# Altium footprint library BaseLib.PcbLib: 62 footprints (part 4 of 4)
Each footprint in its own frame and in the unit in brackets; x right, y up, seen from the top. Pads: shape width x height; smd on the part's side, far side on the other; paste and mask are expansions set on the pad; w line width, h text height; cw(c..) or ccw(c..) is an arc to the next point about the centre after c.
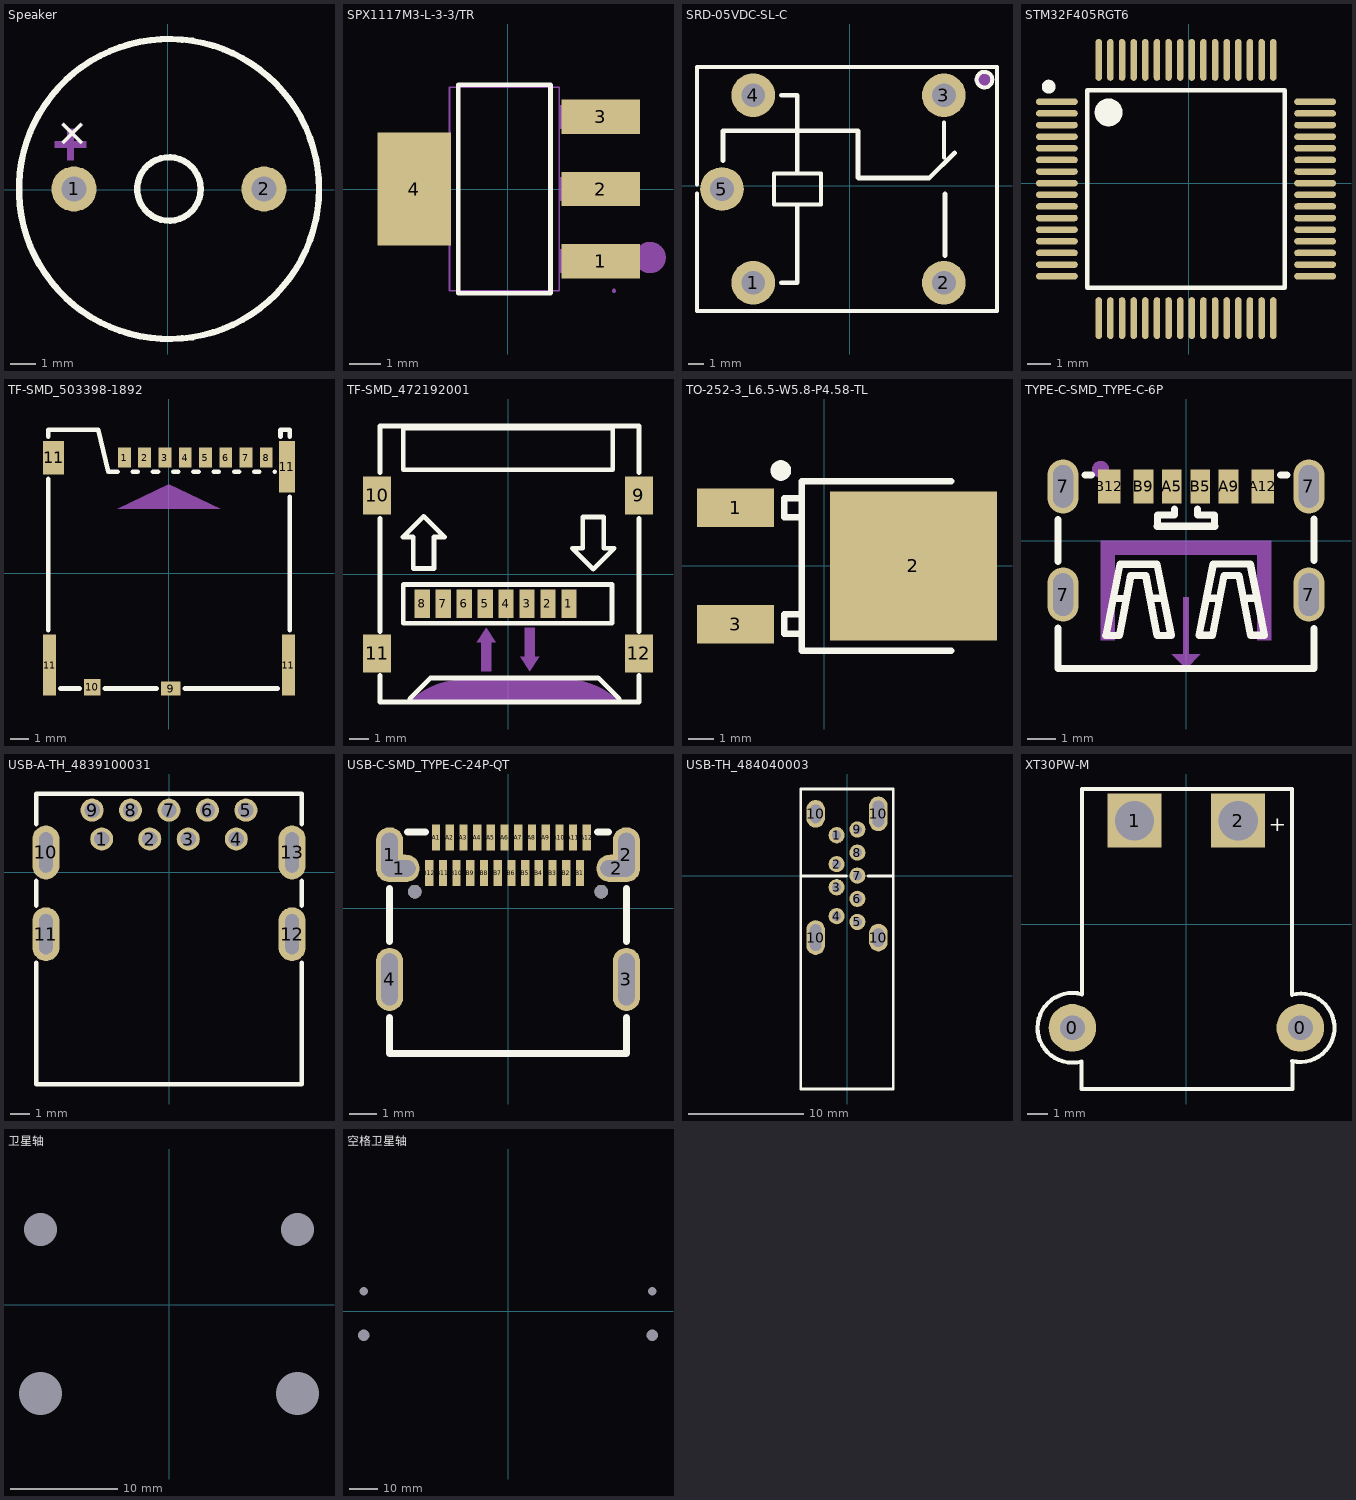
[diagram p3: the footprints below, top view; thin cyan lines are the x and y axes]

## Speaker [mm]
pads (2):
  round 1.8 hole 1: 1(-3.752,0.031) 2(3.848,0.031)
Top Overlay:
  circle w0.254: c0.047,0.031 r6
  circle w0.254: c0.047,0.031 r1.27
  text "+" at -3.948,1.347 h1.27
Mechanical 15:
  region: -4.016,1.301 -4.016,2.444 -3.762,2.444 -3.762,1.174 -4.016,1.174
  region: -4.397,1.936 -3.254,1.936 -3.254,1.682 -4.524,1.682 -4.524,1.936
3D body "Buzzer_Active.stp": height 9.6, standoff -2.6, extent -5.81,-6.052 6.04,5.798

## SPX1117M3-L-3-3/TR [mm] "SOT-223-3_L6.5-W3.4-P2.30-LS7.0-BR"
pads (4):
  rect 2.5x1.1 smd mask+0.051: 1(2.97,-2.3) 2(2.97,0) 3(2.97,2.3)
  rect 2.34x3.6 smd mask+0.051: 4(-2.97,0)
Top Overlay:
  lines w0.152: -1.571,-3.326 1.371,-3.326 1.371,3.326 -1.571,3.326 -1.571,-3.326
Mechanical 6:
  circle w0.5: c4.552,-2.188 r0.25
Mechanical 15:
  region: -3.6,-1.5 -3.6,1.5 -2.85,1.5 -2.85,-1.5
  region: -2.86,-1.5 -2.86,1.5 -1.84,1.5 -1.84,-1.5
  region: 2.65,-2.675 2.65,-1.925 3.4,-1.925 3.4,-2.675
  region: 1.64,-2.675 1.64,-1.925 2.66,-1.925 2.66,-2.675
  region: 2.65,-0.375 2.65,0.375 3.4,0.375 3.4,-0.375
  region: 1.64,-0.375 1.64,0.375 2.66,0.375 2.66,-0.375
  region: 2.65,1.925 2.65,2.675 3.4,2.675 3.4,1.925
  region: 1.64,1.925 1.64,2.675 2.66,2.675 2.66,1.925
  region: 3.46,-3.25 3.46,-3.225 3.425,-3.19 3.375,-3.19 3.34,-3.225 3.34,-3.25 3.34,-3.275 3.375,-3.31 3.425,-3.31 3.46,-3.275
  lines w0.051: -1.85,-3.25 1.65,-3.25 1.65,3.25 -1.85,3.25 -1.85,-3.25
3D body "SOT223-3_MXL.step": height 1.81, standoff 0, extent -3.645,-3.353 3.645,3.353

## SRD-05VDC-SL-C [mil]
pads (5):
  round 110 hole 60: 1(-243.3,-244.13) 2(237.01,-244.11) 3(237.01,228.29) 4(-243.3,228.31) 5(-322.04,-7.91)
Top Overlay:
  circle w10: c339.38,267.7 r19.69
  lines w10: -385,-19.52 -385,-315 370.92,-315 370.91,299.17 ; -385,3.69 -385,299.18 370.91,299.18 ; 236.99,71.59 236.99,159.29 ; -191.13,-47.28 -73.02,-47.28 -73.02,31.46 -191.13,31.46 -191.13,-47.28
  lines w11.81: -319.35,62.95 -319.35,138.83 20.65,138.83 20.65,20.72 21.6,19.77 179.71,19.77 199.71,19.77 ; -172.82,-244.13 -132.75,-244.13 -132.75,-49.3 ; -172.82,228.31 -132.75,228.31 -132.75,33.46 ; 199.62,19.69 264.6,82.99 ; 239.71,-175.51 239.71,-20.21
Mechanical 15:
  circle w19.68: c339.38,267.7 r9.84
3D body "relay srd05vdc-sl-c.SLDPRT": height 590.95, standoff -177.17, extent -379.01,-300.28 369.02,290.28

## STM32F405RGT6 [mm] "LQFP-64_L10.0-W10.0-P0.50-LS12.0-BL"
pads (64):
  oval 1.796x0.28 smd: 1(-5.677,3.496) 2(-5.677,2.996) 3(-5.677,2.496) 4(-5.677,1.996) 5(-5.677,1.496) 6(-5.677,0.996) 7(-5.677,0.496) 8(-5.677,-0.004) 9(-5.677,-0.504) 10(-5.677,-1.004) 11(-5.677,-1.504) 12(-5.677,-2.004) 13(-5.677,-2.504) 14(-5.677,-3.004) 15(-5.677,-3.504) 16(-5.677,-4.004) 33(5.423,-4.004) 34(5.423,-3.504) 35(5.423,-3.004) 36(5.423,-2.504) 37(5.423,-2.004) 38(5.423,-1.504) 39(5.423,-1.004) 40(5.423,-0.504) 41(5.423,-0.004) 42(5.423,0.496) 43(5.423,0.996) 44(5.423,1.496) 45(5.423,1.996) 46(5.423,2.496) 47(5.423,2.996) 48(5.423,3.496)
  oval 0.28x1.796 smd: 17(-3.877,-5.804) 18(-3.377,-5.804) 19(-2.877,-5.804) 20(-2.377,-5.804) 21(-1.877,-5.804) 22(-1.377,-5.804) 23(-0.877,-5.804) 24(-0.377,-5.804) 25(0.123,-5.804) 26(0.623,-5.804) 27(1.123,-5.804) 28(1.623,-5.804) 29(2.123,-5.804) 30(2.623,-5.804) 31(3.123,-5.804) 32(3.623,-5.804) 49(3.623,5.296) 50(3.123,5.296) 51(2.623,5.296) 52(2.123,5.296) 53(1.623,5.296) 54(1.123,5.296) 55(0.623,5.296) 56(0.123,5.296) 57(-0.377,5.296) 58(-0.877,5.296) 59(-1.377,5.296) 60(-1.877,5.296) 61(-2.377,5.296) 62(-2.877,5.296) 63(-3.377,5.296) 64(-3.877,5.296)
Top Overlay:
  lines w0.2: -4.377,-4.504 4.123,-4.504 4.123,3.996 -4.377,3.996 -4.377,-4.504
  lines w0.3: -5.878,4.143 cw(c-6.028,4.144) -5.878,4.145
  lines w0.6: -3.152,3.04 cw(c-3.452,3.043) -3.152,3.045
3D body "User Library-LQFP64-0_5.STEP": height 1.55, standoff -0.02, extent -6.013,-6.14 5.759,5.632

## TF-SMD_503398-1892 [mm]
pads (14):
  rect 0.7x1.1 smd: 1(-2.42,6.27) 2(-1.32,6.27) 3(-0.22,6.27) 4(0.88,6.27) 5(1.98,6.27) 6(3.08,6.27) 7(4.18,6.27) 8(5.28,6.27)
  rect 1.05x0.78 smd: 9(0.095,-6.27)
  rect 0.9x0.9 smd: 10(-4.17,-6.21)
  rect 0.7x3.33 smd: 11(-6.48,-4.995) 11(6.48,-4.995)
  rect 1.14x1.83 smd: 11(-6.26,6.255)
  rect 0.86x2.8 smd: 11(6.4,5.77)
Top Overlay:
  lines w0.254: -6.55,-3.099 -6.55,5.109 ; -6.55,7.401 -6.55,7.78 -3.85,7.78 -3.3,5.5 -2.795,5.5 ; -5.899,-6.27 -4.851,-6.27 ; -3.489,-6.27 -1.1,-6.27 -0.661,-6.27 ; -1.965,5.5 -1.695,5.5 ; -0.865,5.5 -0.595,5.5 ; 0.235,5.5 0.505,5.5 ; 0.851,-6.27 0.935,-6.27 5.899,-6.27 ; 1.335,5.5 1.605,5.5 ; 2.435,5.5 2.705,5.5 ; 3.535,5.5 3.805,5.5 ; 4.635,5.5 4.905,5.5 ; 5.735,5.5 5.739,5.5 ; 6.05,7.401 6.05,7.78 6.55,7.78 6.55,7.401 ; 6.55,-3.099 6.55,4.139
Mechanical 15:
  region: 2.794,3.492 -2.794,3.493 0,4.826

## TF-SMD_472192001 [mm]
pads (12):
  rect 0.8x1.5 smd: 1(3.2,-1.55) 2(2.1,-1.55) 3(1,-1.55) 4(-0.1,-1.55) 5(-1.2,-1.55) 6(-2.3,-1.55) 7(-3.4,-1.55) 8(-4.5,-1.55)
  rect 1.45x2 smd: 9(6.88,4.15) 10(-6.88,4.15) 11(-6.88,-4.15) 12(6.88,-4.15)
Top Overlay:
  lines w0.254: -6.731,-5.3 -6.731,-6.7 6.89,-6.7 ; -6.731,-3 -6.731,2.95 ; -6.731,5.35 -6.731,7.787 ; -6.731,7.797 6.89,7.797 6.89,5.35 ; -6.71,-6.7 6.89,-6.7 ; -5.163,-6.662 -5.163,-6.531 -4.063,-5.432 4.737,-5.432 5.837,-6.532 5.837,-6.662 ; 6.89,-5.3 6.89,-6.7 ; 6.89,-3 6.89,2.95 ; -5.531,1.959 -4.98,2.51 -4.431,3.059 -3.88,2.51 -3.331,1.959 -3.88,1.959 -3.88,0.308 -4.98,0.308 -4.98,1.959 -5.531,1.959 ; -5.5,-2.562 -5.5,-0.53 5.461,-0.53 5.461,-2.562 -5.5,-2.562 ; -5.5,5.497 -5.5,7.697 5.5,7.697 5.5,5.497 -5.5,5.497 ; 3.379,1.372 3.928,1.372 3.928,3.023 5.028,3.023 5.028,1.372 5.579,1.372 5.028,0.821 4.479,0.272 3.928,0.821 3.379,1.372
Mechanical 15:
  region: 1.143,-5.08 1.651,-4.318 1.397,-4.318 1.397,-2.794 0.889,-2.794 0.889,-4.318 0.635,-4.318
  region: -1.143,-2.794 -1.651,-3.556 -1.397,-3.556 -1.397,-5.08 -0.889,-5.08 -0.889,-3.556 -0.635,-3.556
  region: -5.17,-6.7 -5.029,-6.559 -4.72,-6.306 -4.388,-6.084 -4.036,-5.896 -3.667,-5.743 -3.285,-5.627 -2.894,-5.549 -2.497,-5.51 -2.297,-5.51 2.864,-5.51 3.066,-5.502 3.472,-5.528 3.872,-5.595 4.263,-5.703 4.641,-5.851 5.002,-6.038 5.342,-6.26 5.657,-6.516 5.8,-6.66

## TO-252-3_L6.5-W5.8-P4.58-TL [mm]
pads (3):
  rect 3x1.5 smd: 1(-3.457,2.26) 3(-3.457,-2.26)
  rect 6.5x5.8 smd: 2(3.457,0)
Top Overlay:
  lines w0.254: -1.057,-1.88 -1.517,-1.88 -1.557,-1.88 -1.557,-2.63 -0.877,-2.63 -0.877,-2.611 ; -1.057,2.64 -1.517,2.64 -1.557,2.64 -1.557,1.89 -0.877,1.89 -0.877,1.909 ; 4.923,-3.3 -0.877,-3.3 -0.877,3.3 4.923,3.3
  lines w0.4: -1.699,3.51 cw(c-1.698,3.71) -1.697,3.51
Mechanical 15:
  circle w0.4: c-4.39,2.25 r0.2

## TYPE-C-SMD_TYPE-C-6P [mm]
pads (10):
  oval 1.1x1.9 hole 0.7 slot 1.5 at 90 deg: 7(-4.32,-1.9) 7(-4.32,1.9) 7(4.32,-1.9) 7(4.32,1.9)
  rect 0.7x1.2 smd: A5(-0.5,1.9) A9(1.5,1.9) B5(0.5,1.9) B9(-1.5,1.9)
  rect 0.8x1.2 smd: A12(2.7,1.9) B12(-2.7,1.9)
Top Overlay:
  lines w0.25: -4.501,-3.101 -4.501,-3.078 -4.501,-4.501 4.501,-4.501 4.501,-3.101 ; -4.5,-0.742 -4.5,0.7 -4.5,0.742 ; -3.541,2.3 -3.329,2.3 ; -1.01,0.5 1.01,0.5 ; -1,0.5 -1,0.9 -0.4,0.9 -0.4,1.1 ; 0.4,1.1 0.4,0.9 1,0.9 1,0.5 ; 3.329,2.3 3.541,2.3 ; 4.5,-0.7 4.5,0.75
  lines w0.254: -2.518,-2.033 -2.119,-2.033 ; -1.219,-2.032 -0.819,-2.032 ; 0.759,-2.028 1.158,-2.028 ; 2.058,-2.027 2.458,-2.027 ; -2.818,-3.333 -2.343,-3.333 -1.941,-1.233 -1.413,-1.233 -1.014,-3.333 -0.519,-3.333 -1.019,-0.831 -2.32,-0.831 -2.818,-3.333 ; 0.459,-3.328 0.934,-3.328 1.335,-1.228 1.864,-1.228 2.263,-3.328 2.758,-3.328 2.257,-0.826 0.957,-0.826 0.459,-3.328
Top Paste:
  region: 3.77,-1.5 3.77,-1.391 3.854,-1.188 4.008,-1.034 4.21,-0.95 4.429,-0.95 4.631,-1.034 4.786,-1.188 4.87,-1.391 4.87,-1.5 4.87,-2.3 4.87,-2.409 4.786,-2.612 4.631,-2.766 4.429,-2.85 4.21,-2.85 4.008,-2.766 3.854,-2.612 3.77,-2.409 3.77,-2.3
  region: -4.87,-1.5 -4.87,-1.391 -4.786,-1.188 -4.631,-1.034 -4.429,-0.95 -4.21,-0.95 -4.008,-1.034 -3.854,-1.188 -3.77,-1.391 -3.77,-1.5 -3.77,-2.3 -3.77,-2.409 -3.854,-2.612 -4.008,-2.766 -4.21,-2.85 -4.429,-2.85 -4.631,-2.766 -4.786,-2.612 -4.87,-2.409 -4.87,-2.3
  region: 3.77,2.3 3.77,2.409 3.854,2.612 4.008,2.766 4.21,2.85 4.429,2.85 4.631,2.766 4.786,2.612 4.87,2.409 4.87,2.3 4.87,1.5 4.87,1.391 4.786,1.188 4.631,1.034 4.429,0.95 4.21,0.95 4.008,1.034 3.854,1.188 3.77,1.391 3.77,1.5
  region: -4.87,2.3 -4.87,2.409 -4.786,2.612 -4.631,2.766 -4.429,2.85 -4.21,2.85 -4.008,2.766 -3.854,2.612 -3.77,2.409 -3.77,2.3 -3.77,1.5 -3.77,1.391 -3.854,1.188 -4.008,1.034 -4.21,0.95 -4.429,0.95 -4.631,1.034 -4.786,1.188 -4.87,1.391 -4.87,1.5
  region: -3.1,2.5 -2.3,2.5 -2.3,1.3 -3.1,1.3
  region: -1.85,2.5 -1.15,2.5 -1.15,1.3 -1.85,1.3
  region: -0.85,2.5 -0.15,2.5 -0.15,1.3 -0.85,1.3
  region: 0.15,2.5 0.85,2.5 0.85,1.3 0.15,1.3
  region: 1.15,2.5 1.85,2.5 1.85,1.3 1.15,1.3
  region: 2.3,2.5 3.1,2.5 3.1,1.3 2.3,1.3
Mechanical 15:
  circle w0.3: c-3,2.5 r0.15
  region: 0,-4 -0.1,-4 -0.1,-2 0.1,-2 0.1,-4
  region: -0.5,-4 0.5,-4 0,-4.5
  region: -2.5,0 2.5,0 2.5,-0.5 -2.5,-0.5
  region: 3,-3.5 3,0 2.5,0 2.5,-3.5
  region: -3,-3.5 -3,0 -2.5,0 -2.5,-3.5

## USB-A-TH_4839100031 [mm]
pads (13):
  round 1.2 hole 0.8: 1(-3.5,1.725) 2(-1,1.725) 3(1,1.725) 4(3.5,1.725) 5(4,3.225) 6(2,3.225) 7(0,3.225) 8(-2,3.225) 9(-4,3.225)
  oval 1.4x2.8 hole 0.7 slot 2.1 at 90 deg: 10(-6.4,1.025) 11(-6.4,-3.225) 12(6.4,-3.225) 13(6.4,1.025)
Top Overlay:
  lines w0.254: -6.9,-4.71 -6.9,-11.025 6.9,-11.025 6.9,-4.71 ; -6.9,-1.74 -6.9,-0.46 ; -6.9,2.51 -6.9,4.075 6.9,4.075 6.9,2.51 ; 6.9,-1.74 6.9,-0.46

## USB-C-SMD_TYPE-C-24P-QT [mm]
pads (32):
  oval 1x2 hole 0.6 slot 1.6 at 90 deg: 1(-4.32,1.963) 2(4.32,1.963)
  oval 1.5x1 hole 0.6 slot 1.2 at 0 deg: 1(-3.97,1.463) 2(3.97,1.463)
  oval 1x2.3 hole 0.6 slot 1.9 at 90 deg: 3(4.32,-2.587) 4(-4.32,-2.587)
  rect 0.3x0.95 smd: A1(-2.625,2.588) A2(-2.125,2.588) A3(-1.625,2.588) A4(-1.125,2.588) A5(-0.625,2.588) A6(-0.125,2.588) A7(0.375,2.588) A8(0.875,2.588) A9(1.375,2.588) A10(1.875,2.588) A11(2.375,2.588) A12(2.875,2.588) B1(2.625,1.288) B2(2.125,1.288) B3(1.625,1.288) B4(1.125,1.288) B5(0.625,1.288) B6(0.125,1.288) B7(-0.375,1.288) B8(-0.875,1.288) B9(-1.375,1.288) B10(-1.875,1.288) B11(-2.375,1.288) B12(-2.875,1.288)
  round 0.5 hole 0.5 unplated: ""(-3.4,0.613) ""(3.4,0.613)
Top Overlay:
  lines w0.254: -4.32,-3.969 -4.32,-5.287 4.32,-5.287 4.32,-3.969 ; -4.32,-1.206 -4.32,0.731 ; -3.669,2.794 -3.006,2.794 ; 3.256,2.794 3.669,2.794 ; 4.32,-1.206 4.32,0.731
Top Paste:
  drawing of 28 lines, arcs and shapes, not listed
Mechanical 15:
  circle w0.2: c3.4,0.613 r0.1
  circle w0.2: c-3.4,0.613 r0.1

## USB-TH_484040003 [mm]
pads (13):
  round 1.4 hole 0.8: 1(-0.9,3.5) 2(-0.9,1) 3(-0.9,-1) 4(-0.9,-3.5) 5(0.9,-4) 6(0.9,-2) 7(0.9,0) 8(0.9,2) 9(0.9,4)
  oval 1.6x3 hole 1 slot 2.3 at 90 deg: 10(-2.71,-5.35) 10(2.71,5.35)
  oval 1.6x2.4 hole 1 slot 1.6 at 90 deg: 10(-2.71,5.35) 10(2.71,-5.35)
Top Overlay:
  lines w0.254: -4,-0.04 -0.03,-0.04 ; 1.83,-0.04 4,-0.04 ; -4,-18.45 4,-18.45 4,7.5 -4,7.5 -4,-18.45

## XT30PW-M [mm]
pads (4):
  round 2.3 hole 1.2: 0(-5.5,-5) 0(5.5,-5)
  rect 2.6x2.6 hole 1.9: 1(-2.5,5) 2(2.5,5)
Top Overlay:
  lines w0.2: 5.109,-6.601 ccw(c5.5,-5) 5.093,-3.403 5.093,1.444 5.093,6.524 -5.04,6.524 -5.04,1.571 -5.04,-3.382 ccw(c-5.5,-5) -5.057,-6.623 -5.057,-7.954 5.12,-7.954 5.12,-6.601
  text "+" at 3.977,4.238 h1.27
3D body "User Library-XT30PW-M.STEP": height 5, standoff -2, extent -6.673,-7.945 6.627,6.005

## 卫星轴 [mil] "stab"
pads (4):
  round 0 hole 120: 0(-470,275) 3(470,275)
  round 0 hole 157: 1(-470,-325) 4(470,-325)
3D body "Stabilizer - open.STEP": height 622.05, standoff -98.43, extent -599.33,-435 609.33,320.91

## 空格卫星轴 [mil] "stab"
pads (4):
  round 0 hole 120: 0(1970,275) 3(-1970,275)
  round 0 hole 157: 1(1970,-325) 4(-1970,-325)
3D body "mx Stabilizer base 16828.SLDPRT": height 299.21, standoff -98.43, extent -2102.72,-432.95 -1835,322.95
3D body "mx Stabilizer key 16828.SLDPRT": height 460.63, standoff -9.84, extent -2056.61,-174.37 -1883.39,152.4
3D body "mx Stabilizer base 16828.SLDPRT": height 299.21, standoff -98.43, extent 1836.14,-428.07 2103.86,327.83
3D body "mx Stabilizer key 16828.SLDPRT": height 460.63, standoff -9.84, extent 1883.39,-159.37 2056.61,167.4